# Altium footprint library aiskylab-14Connectors-19PWRCon.PcbLib: 63 footprints (part 4 of 4)
Each footprint in its own frame and in the unit in brackets; x right, y up, seen from the top. Pads: shape width x height; smd on the part's side, far side on the other; paste and mask are expansions set on the pad; w line width, h text height; cw(c..) or ccw(c..) is an arc to the next point about the centre after c.
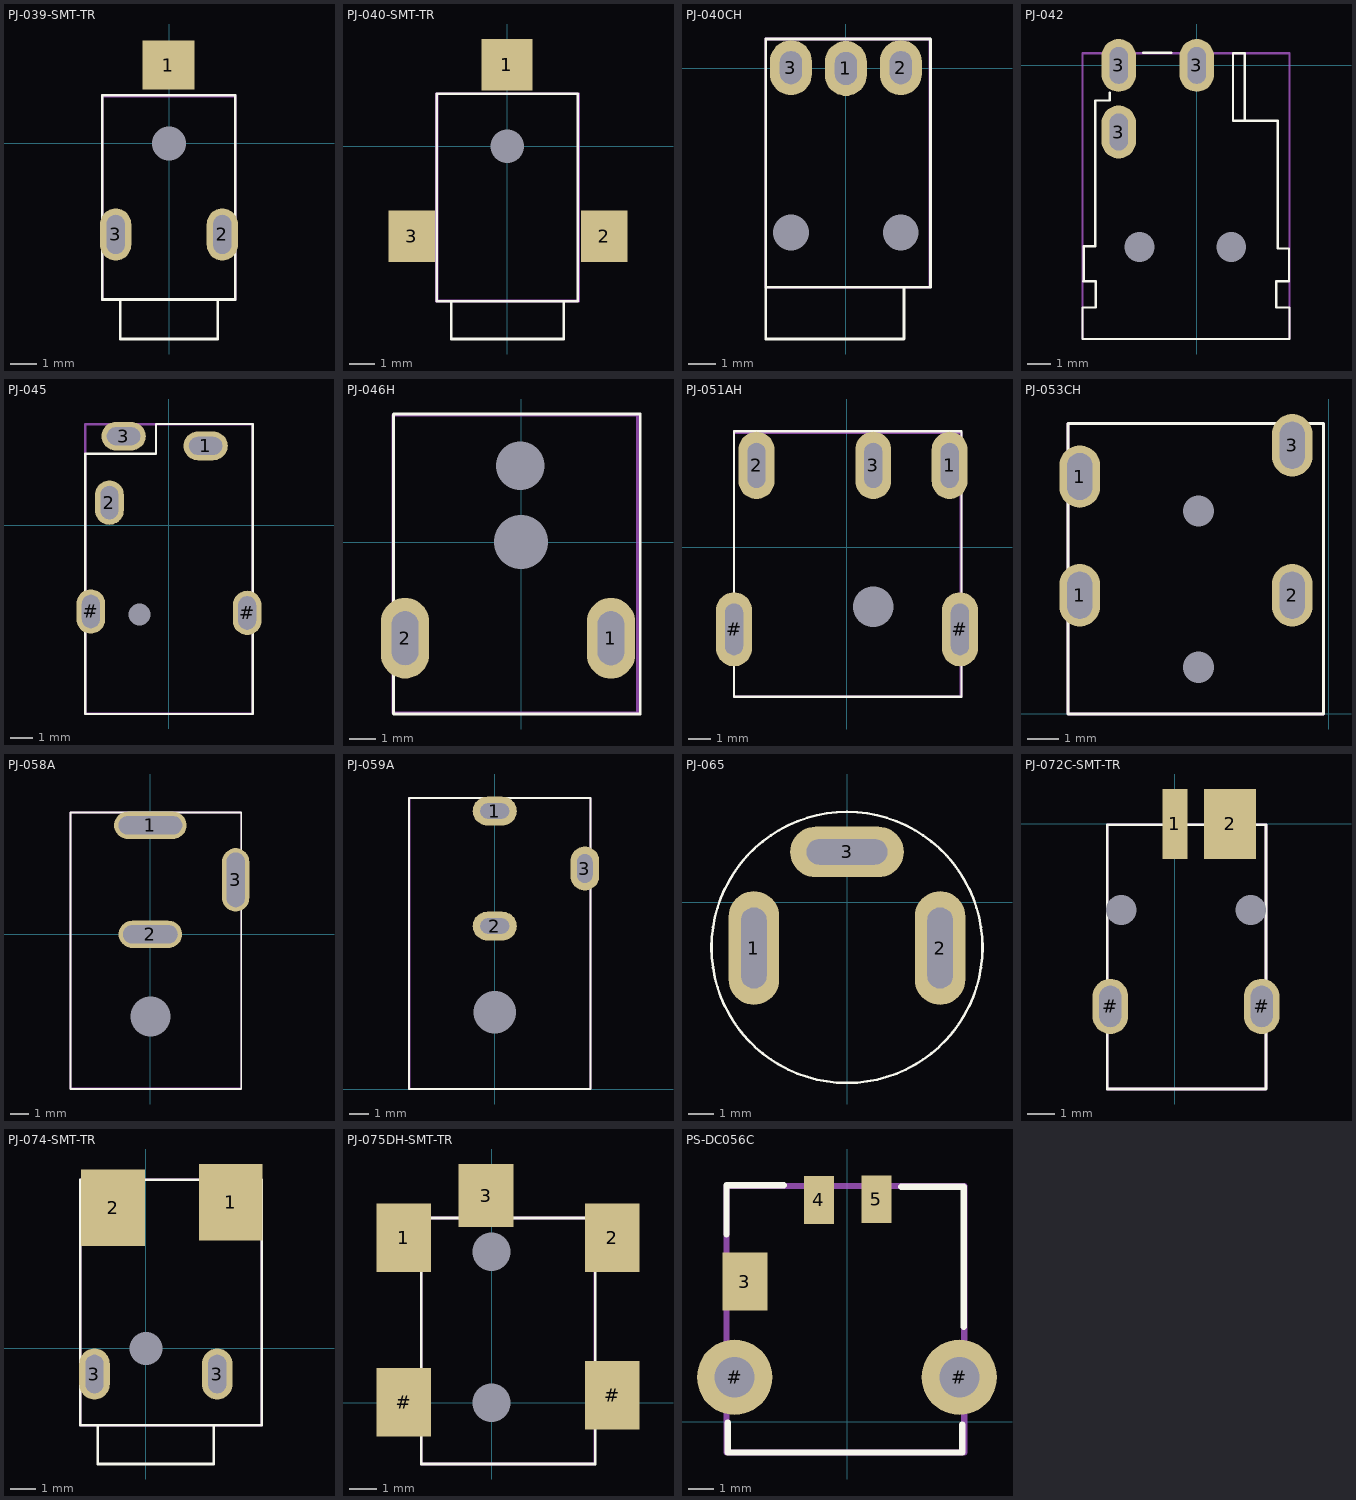
[diagram p3: the footprints below, top view; thin cyan lines are the x and y axes]

## PJ-039-SMT-TR [mm] "CONN PWR JACK 0.7X2.35MM SOLDER CUI inc"
height 22.7
pads (4):
  rect 2x1.9 smd: 1(-0.025,3.017)
  oval 1.2x2 hole 0.7 slot 1.5 at 90 deg: 2(2.05,-3.5) 3(-2.05,-3.5)
  round 0 hole 1.3: #(0,0)
Top Overlay:
  lines w0.1: -1.88,-6.02 -1.88,-7.518 1.88,-7.518 1.88,-6 ; -2.565,-6 -2.565,1.849 2.54,1.849 2.54,-6 -2.565,-6
Top Designator:
  text ".Designator" at -7.618,-2.258 h1.52
Top Component Outline:
  lines w0.1: -2.565,-6 2.54,-6 2.54,1.823 -2.565,1.823 -2.565,-6
Top 3D Body:
  lines w0.1: -2.565,-6 -2.565,1.849 2.54,1.849 2.54,-6 -2.565,-6
3D body "pj-039-smt-tr.stp": height 3.5, standoff -1, extent -2.5,-7.5 2.5,3.4

## PJ-040-SMT-TR [mm] "CONN PWR JACK 0.7X2.35MM SOLDER  CUI Inc."
height 22.7
pads (4):
  rect 2x2 smd: 1(-0.011,3.184)
  rect 1.8x2 smd: 2(3.781,-3.5) 3(-3.718,-3.5)
  round 0 hole 1.3: #(0,0)
Top Overlay:
  lines w0.1: -2.186,-6.044 -2.186,-7.51 2.199,-7.51 2.199,-6.044 ; -2.74,-6.031 -2.74,2.053 2.754,2.053 2.754,-6.031 -2.74,-6.031
Top Designator:
  text ".Designator" at -7.586,-2.145 h1.52
Top Component Outline:
  lines w0.1: -2.722,-6.013 -2.722,2.053 2.772,2.053 2.772,-6.013 -2.722,-6.013
Top 3D Body:
  lines w0.1: -2.757,-6.03 -2.757,2.053 2.789,2.053 2.789,-6.03 -2.757,-6.03
3D body "pj-040-smt-tr.stp": height 3.1, standoff -0.6, extent -3.675,-7.513 3.725,3.387

## PJ-040CH [mm] "CONN PWR JACK 1X3.4MM SOLDER CUI inc"
height 22.7
pads (5):
  oval 1.524x2 hole 0.8 slot 1.2 at 90 deg unplated: 1(0,0) 2(2,0.031) 3(-2,0.031)
  round 0 hole 1.3: #(-2,-5.969) #(2,-5.969)
Top Overlay:
  lines w0.1: 2.115,-7.969 2.115,-9.849 1.454,-9.849 -2.914,-9.849 -2.914,-7.969 ; -2.914,-7.969 -2.914,1.073 3.08,1.073 3.08,-7.969 -2.914,-7.969
Top Designator:
  text ".Designator" at -7.535,-4.881 h1.52
Top Component Outline:
  lines w0.1: -2.914,-7.969 -2.914,1.073 3.055,1.073 3.055,-7.969 -2.914,-7.969
Top 3D Body:
  lines w0.1: -2.914,-7.969 -2.914,1.073 3.055,1.073 3.055,-7.969 -2.914,-7.969
3D body "pj-040ch.stp": height 5.1, standoff -2.9, extent -2.914,-9.849 3.086,1.151

## PJ-042 [mm] "CONN POWER JACK 1.75X4.75MM CUI inc"
height 22.7
pads (5):
  oval 1.5x2.3 hole 0.8 slot 1.6 at 90 deg unplated: 3(-3.4,-2.9) 3(-3.4,0) 3(0,0)
  round 0 hole 1.3: #(-2.5,-7.9) #(1.5,-7.9)
Top Overlay:
  lines w0.1: -3.785,-1.192 -3.785,-1.524 -4.42,-1.524 -4.42,-7.874 -4.928,-7.874 -4.928,-9.398 -4.953,-9.398 -4.394,-9.398 -4.394,-10.541 -4.978,-10.541 -4.978,-11.913 4.039,-11.913 4.039,-10.541 3.454,-10.541 3.454,-9.398 4.013,-9.398 ; -2.341,0.549 -1.097,0.549 ; 2.083,-2.413 2.083,0.533 1.575,0.533 1.575,-2.413 3.531,-2.413 3.531,-7.976 3.962,-7.976 4.013,-7.976 4.013,-9.398 ; 4.013,-9.398 3.962,-9.398 4.013,-9.398
Top Designator:
  text ".Designator" at -8.087,-5.863 h1.52
Top Component Outline:
  lines w0.1: -4.978,-11.913 -4.978,0.533 4.039,0.533 4.039,-11.913 -4.978,-11.913
Top 3D Body:
  lines w0.1: -4.978,-11.913 4.039,-11.913 4.039,0.533 -4.978,0.533 -4.978,-11.913
3D body "pj-042.stp": height 6, standoff -2.5, extent -4.953,-11.914 4.047,0.586

## PJ-045 [mm] "CONN PWR JACK 1.7X4MM SOLDER CUI inc"
height 22.7
pads (6):
  oval 2x1.3 hole 0.8 slot 1.5 at 0 deg unplated: 1(1.648,3.582) 3(-2.047,4.017)
  oval 1.3x2 hole 0.8 slot 1.5 at 90 deg unplated: 2(-2.684,1.025) #(-3.522,-3.879) #(3.522,-3.944)
  round 0 hole 1: #(-1.327,-4.017)
Top Overlay:
  lines w0.1: -3.771,3.226 -3.771,-8.496 3.772,-8.496 3.772,4.561 -0.581,4.561 ; -3.753,3.226 -0.581,3.226 -0.581,4.55
Top Designator:
  text ".Designator" at -7.618,-2.397 h1.52
Top Component Outline:
  lines w0.1: -3.771,-8.487 -3.771,4.561 3.772,4.561 3.772,-8.487 -3.771,-8.487
Top 3D Body:
  lines w0.1: -3.769,-8.49 -3.769,4.56 3.773,4.56 3.773,-8.49 -3.769,-8.49
3D body "pj-045.stp": height 6.4, standoff -2.5, extent -3.765,-8.477 3.735,4.523

## PJ-046H [mm] "CUI inc"
height 22.7
pads (4):
  oval 1.8x3 hole 1 slot 2 at 90 deg unplated: 1(3.344,-3.572) 2(-4.311,-3.569)
  round 0 hole 1.8: #(-0.032,2.843)
  round 0 hole 2: #(0,0)
Top Overlay:
  lines w0.1: -4.74,-6.388 4.429,-6.388 4.429,4.763 -4.74,4.763 -4.74,-6.388
Top Designator:
  text ".Designator" at -8.034,-1.32 h1.52
Top Component Outline:
  lines w0.1: -4.766,-6.337 -4.766,4.712 4.328,4.712 4.328,-6.337 -4.766,-6.337
Top 3D Body:
  lines w0.1: -4.766,-6.337 4.353,-6.337 4.353,4.712 -4.766,4.712 -4.766,-6.337
3D body "pj-046h.stp": height 13, standoff -3, extent -4.701,-6.299 4.299,4.701

## PJ-051AH [mm] "CONN PWR JACK 2X5.5MM SOLDER CUI inc."
height 22.7
pads (6):
  oval 1.6x3 hole 0.8 slot 2 at 90 deg: 1(4.57,3.65) 2(-4.03,3.65) 3(1.17,3.65)
  oval 1.6x3.3 hole 0.8 slot 2.3 at 90 deg: #(-5.03,-3.65) #(5.03,-3.65)
  round 0 hole 1.8 square: #(1.17,-2.65)
Top Overlay:
  lines w0.1: -5.03,-6.65 5.095,-6.65 5.095,5.169 -5.03,5.169 -5.03,-6.65
Top Designator:
  text ".Designator" at -7.618,-1.232 h1.52
Top Component Outline:
  lines w0.1: -5.03,-6.65 -5.03,5.169 5.07,5.169 5.07,-6.65 -5.03,-6.65
Top 3D Body:
  lines w0.1: -5.03,5.1 5.095,5.1 5.095,-6.65 -5.03,-6.65 -5.03,5.169
3D body "pj-051a.stp": height 7.3, standoff -2.5, extent -5.03,-6.65 5.07,5.1

## PJ-053CH [mm] "CONN PWR JACK 1X3.4MM SOLDER CUI inc"
height 22.7
pads (6):
  oval 1.3x2 hole 0.8 slot 1.5 at 90 deg unplated: 1(-7.976,3.8) 1(-7.975,7.6) 2(-1.176,3.8) 3(-1.176,8.6)
  round 0 hole 1: #(-4.176,1.5) #(-4.176,6.5)
Top Overlay:
  lines w0.1: -8.357,0 -0.178,0 -0.178,9.296 -8.357,9.296 -8.357,0
Top Designator:
  text ".Designator" at -12.045,4.318 h1.52
Top Component Outline:
  lines w0.1: -8.357,0 -8.357,9.296 -0.178,9.296 -0.178,0 -8.357,0
Top 3D Body:
  lines w0.1: -8.357,0 -0.178,0 -0.178,9.296 -8.357,9.296 -8.357,0
3D body "pj-053ch.stp": height 5.3, standoff -2.4, extent -8.328,-0.027 -0.178,9.273

## PJ-058A [mm] "CONN PWR JACK 2X5.5MM SOLDER  CUI inc"
height 22.7
pads (4):
  oval 4x1.5 hole 1 slot 3.5 at 0 deg: 1(0,6)
  oval 3.5x1.5 hole 1 slot 3 at 0 deg: 2(0,0)
  oval 1.5x3.5 hole 1 slot 3 at 90 deg: 3(4.7,3)
  round 0 hole 2.2: #(0,-4.514)
Top Overlay:
  lines w0.1: -4.394,-8.514 -4.394,6.7 5.006,6.7 5.006,-8.514 -4.394,-8.514
Top Designator:
  text ".Designator" at -7.064,-1.364 h1.52
Top Component Outline:
  lines w0.1: -4.394,-8.484 5.006,-8.484 5.006,6.7 -4.394,6.7 -4.394,-8.484
Top 3D Body:
  lines w0.1: -4.394,-8.484 -4.394,6.7 5.006,6.7 5.006,-8.484 -4.394,-8.484
3D body "pj-058a.stp": height 11, standoff -3.5, extent -4.394,-8.514 5.006,6.686

## PJ-059A [mm] "CONN PWR JACK 2X5.5MM SOLDER  CUI inc"
height 22.7
pads (4):
  oval 2.3x1.5 hole 0.8 slot 1.5 at 0 deg: 1(0,14.5) 2(0,8.5)
  oval 1.5x2.3 hole 0.8 slot 1.5 at 90 deg: 3(4.7,11.5)
  round 0 hole 2.2: #(0,4)
Top Overlay:
  lines w0.1: -4.47,0 -4.47,15.189 5.004,15.189 5.004,0 -4.47,0
Top Designator:
  text ".Designator" at -7.102,7.143 h1.52
Top Component Outline:
  lines w0.1: -4.47,0 -4.47,15.189 4.978,15.189 4.978,0 -4.47,0
Top 3D Body:
  lines w0.1: -4.445,0 -4.445,15.189 5.004,15.189 5.004,0 -4.445,0
3D body "pj-059ah.stp": height 11.1, standoff -3.4, extent -4.446,-0.011 4.954,15.189

## PJ-065 [mm] "板载自添焊盘"
height 22.7
pads (3):
  oval 2x4.5 hole 1 slot 3.2 at 90 deg: 1(-3.683,-1.8) 2(3.683,-1.8)
  oval 4.5x2 hole 1 slot 3.2 at 0 deg: 3(0,2)
Top Overlay:
  circle w0.1: c0,-1.778 r5.36
Top Designator:
  text ".Designator" at -7.509,-2.222 h1.52
3D body "pj-065a.stp": height 18, standoff -5.2, extent -5.373,-7.264 5.627,3.836

## PJ-072C-SMT-TR [mm] "CONN PWR JACK 1X3.4MM SOLDER CUI inc"
height 22.7
pads (6):
  rect 0.9x2.54 smd: 1(0,0)
  rect 1.9x2.54 smd: 2(2,0)
  oval 1.3x2 hole 0.8 slot 1.5 at 90 deg: #(-2.35,-6.627) #(3.15,-6.627)
  round 0 hole 1.1: #(-1.95,-3.127) #(2.75,-3.127)
Top Overlay:
  lines w0.1: -2.464,-9.627 3.302,-9.627 3.302,-0.025 -2.464,-0.025 -2.464,-9.627
Top Designator:
  text ".Designator" at -7.218,-4.66 h1.52
Top 3D Body:
  lines w0.1: -2.464,-9.627 3.302,-9.627 ; -2.464,-9.627 -2.464,-0.025 ; -2.464,-9.627 3.302,-9.627 ; -2.464,-9.627 -2.464,-0.025 ; -2.464,-0.025 3.302,-0.025 ; -2.464,-0.025 3.302,-0.025 ; 3.302,-9.627 3.302,-0.025 ; 3.302,-9.627 3.302,-0.025
3D body "pj-072c-smt-tr.stp": height 4.9, standoff -0.85, extent -2.473,-9.62 3.327,0.78

## PJ-074-SMT-TR [mm] "CONN PWR JACK 0.9X3.2MM SOLDER CUI inc"
height 22.7
pads (5):
  rect 2.5x3 smd: 1(3.315,5.712) 2(-1.283,5.5)
  oval 1.2x2 hole 0.7 slot 1.5 at 90 deg: 3(-2.013,-1) 3(2.787,-1)
  round 0 hole 1.3: #(0,0)
Top Overlay:
  lines w0.1: -1.88,-3.02 -1.88,-4.518 1.88,-4.518 2.654,-4.518 2.654,-3 ; -2.565,-3 -2.565,6.601 4.534,6.601 4.534,-3 -2.565,-3
Top Designator:
  text ".Designator" at -6.642,0.865 h1.52
Top Component Outline:
  lines w0.1: -2.565,-3 -2.565,6.601 4.534,6.601 4.534,-3 -2.565,-3
Top 3D Body:
  lines w0.1: -2.565,-3 -2.565,6.601 4.534,6.601 4.534,-3 -2.565,-3
3D body "pj-074-smt-tr.stp": height 4.7, standoff -0.7, extent -2.603,-4.461 4.397,6.539

## PJ-075DH-SMT-TR [mm] "CONN PWR JACK 1.3X3.4MM SOLDER CUI inc"
height 22.7
pads (7):
  rect 2x2.5 smd: 1(-3.2,6.015) 2(4.4,6.015) #(-3.2,0.015) #(4.4,0.265)
  rect 2x2.3 smd: 3(-0.2,7.55)
  round 0 hole 1.4: #(0,0) #(0,5.5)
Top Overlay:
  lines w0.1: -2.565,-2.235 -2.565,6.731 3.785,6.731 3.785,-2.235 -2.565,-2.235
Top Designator:
  text ".Designator" at -7.018,2.728 h1.52
Top Component Outline:
  lines w0.1: -2.565,-2.235 3.759,-2.235 3.759,6.731 -2.565,6.731 -2.565,-2.235
Top 3D Body:
  lines w0.1: -2.565,-2.235 -2.565,6.731 3.759,6.731 3.759,-2.235 -2.565,-2.235
3D body "pj-075dh-smt-tr.stp": height 4.7, standoff -0.5, extent -3.698,-2.331 4.902,7.969

## PS-DC056C [mm]
pads (5):
  rect 1.8x2.3 smd: 3(-4.064,5.588)
  rect 1.2x1.9 smd: 4(-1.118,8.839) 5(1.168,8.865)
  round 3 hole 1.6: #(-4.475,1.778) #(4.475,1.778)
Top Overlay:
  lines w0.254: -4.801,7.468 -4.801,9.423 -2.515,9.423 ; -4.75,-0.025 -4.75,-1.219 4.597,-1.219 4.597,-0.102 ; 2.159,9.373 4.648,9.373 4.648,3.785
Top Designator:
  text ".Designator" at -7.618,3.777 h1.52
Top Component Outline:
  lines w0.254: -4.801,-1.219 4.674,-1.219 4.674,9.398 -4.801,9.398 -4.801,-1.219
3D body "ps-dc056c1.stp": height 3, standoff -1.2, extent -4.6,-1.198 4.6,9.252